# Altium footprint library SIM-Memory_Card Connectors.PcbLib: 17 footprints (part 1 of 2)
Each footprint in its own frame and in the unit in brackets; x right, y up, seen from the top. Pads: shape width x height; smd on the part's side, far side on the other; paste and mask are expansions set on the pad; w line width, h text height; cw(c..) or ccw(c..) is an arc to the next point about the centre after c.
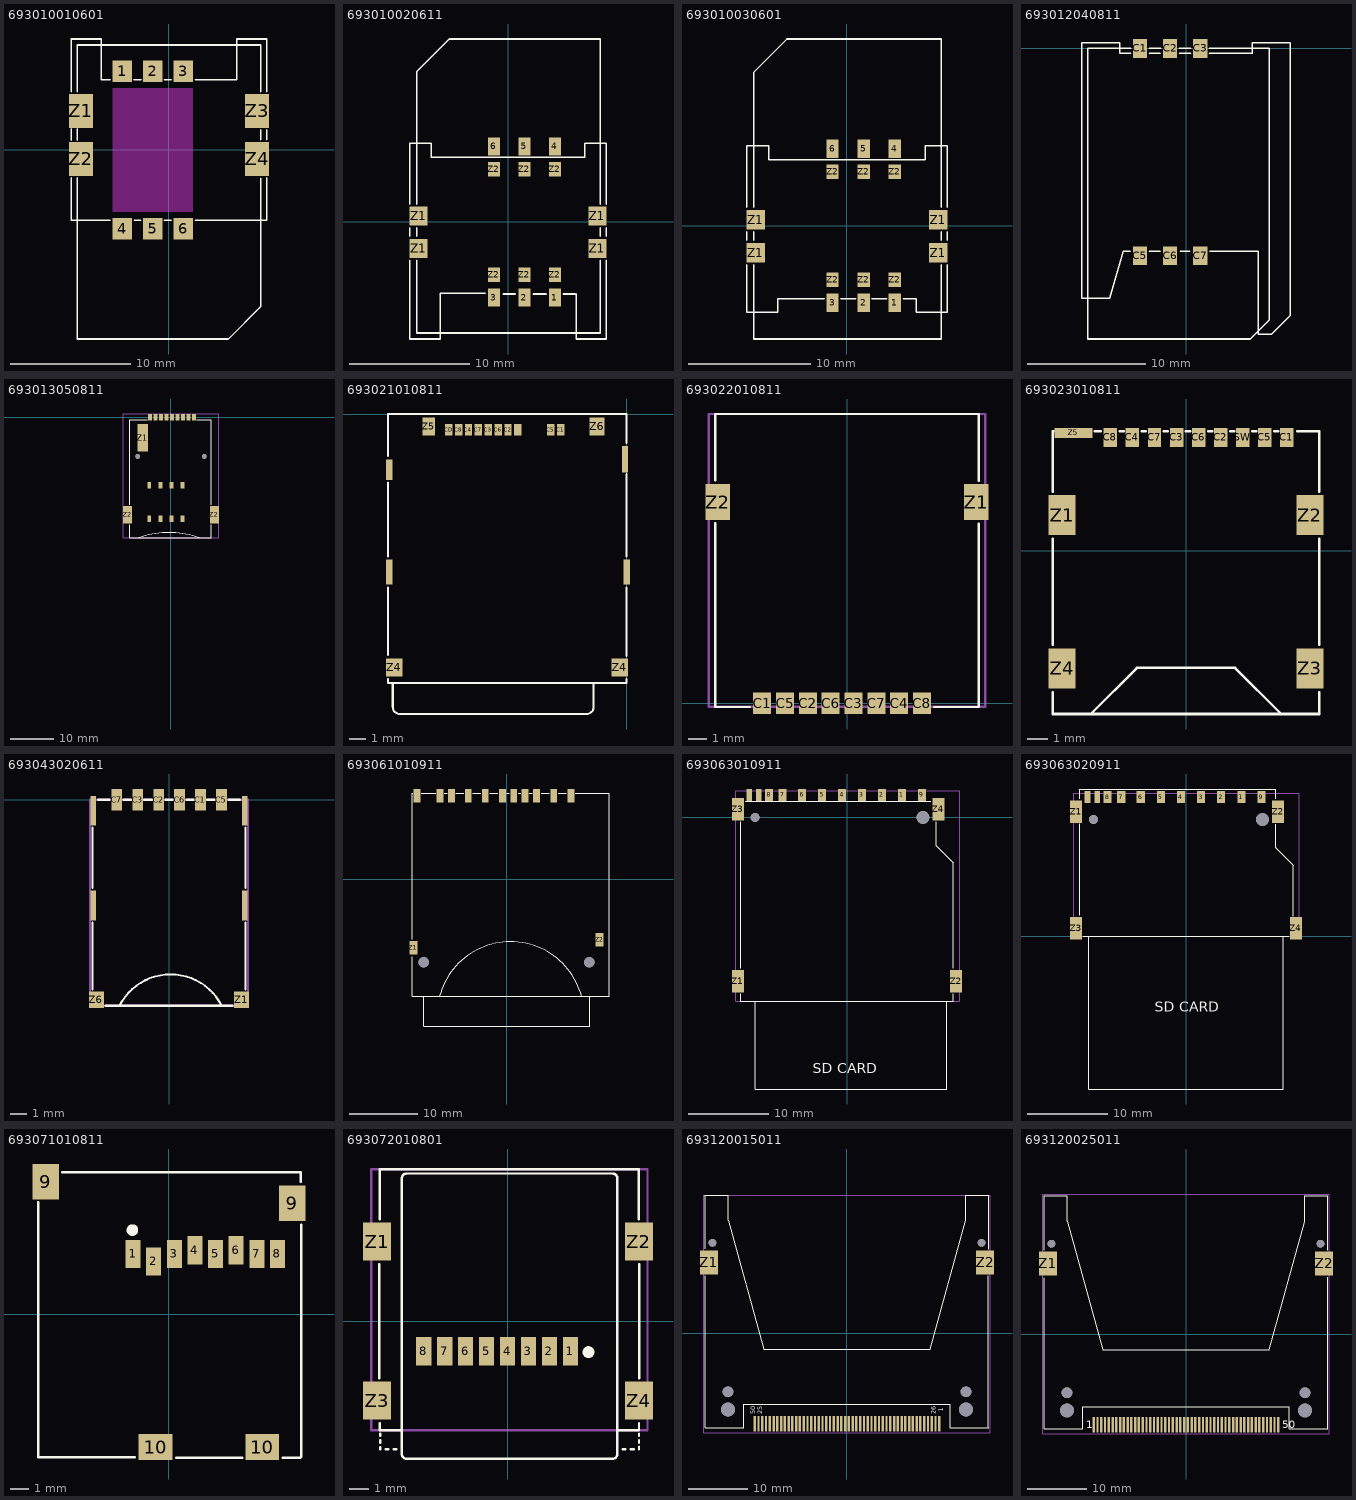
[diagram p0: the footprints below, top view; thin cyan lines are the x and y axes]

## 693010010601 [mm] "WR-CRD Mini SIM_Standard Header 6 pins    1.7 Heigth"
height 1.7
pads (10):
  rect 1.6x1.8 smd: 1(-3.9,6.55) 2(-1.36,6.55) 3(1.18,6.55) 4(-3.9,-6.55) 5(-1.36,-6.55) 6(1.18,-6.55)
  rect 2x2.8 smd: Z1(-7.35,3.25) Z2(-7.35,-0.75) Z3(7.35,3.25) Z4(7.35,-0.75)
Top Overlay:
  lines w0.127: -8.15,-2.3 -8.15,-5.85 -4.9,-5.85 ; -8.15,0.8 -8.15,1.75 ; -8.15,4.85 -8.15,9.25 -5.65,9.25 -5.65,5.85 -4.9,5.85 ; -7.65,-2.3 -7.65,-15.75 4.95,-15.75 7.65,-13.05 7.65,-2.35 ; -7.65,0.8 -7.65,1.75 ; -7.65,4.85 -7.65,8.75 7.65,8.75 7.65,4.85 ; -2.95,5.85 -2.3,5.85 ; -2.9,-5.85 -2.35,-5.85 ; -0.4,-5.85 0.2,-5.85 ; -0.4,5.85 0.2,5.85 ; 2.2,-5.85 8.15,-5.85 8.15,-2.3 ; 2.2,5.85 5.65,5.85 5.65,9.25 8.15,9.25 8.15,4.85 ; 7.65,0.85 7.65,1.7 ; 8.15,0.85 8.15,1.7
Keep-Out Layer:
  rectangle: -4.7,-5.15 1.98,5.15
3D body "693010010601.stp": height 1.71, standoff -0.04, extent -8.15,-6.85 8.15,9.25

## 693010020611 [mm] "WR-CRD Mini SIM_header_Shielded_6 pins    1.8 Heigth"
height 1.8
pads (16):
  rect 1x1.5 smd: 1(3.9,-6.3) 2(1.36,-6.3) 3(-1.18,-6.3) 4(3.9,6.3) 5(1.36,6.3) 6(-1.18,6.3)
  rect 1.5x1.6 smd: Z1(-7.45,-2.2) Z1(-7.45,0.5) Z1(7.45,-2.2) Z1(7.45,0.5)
  rect 1x1.2 smd: Z2(-1.18,-4.4) Z2(-1.18,4.4) Z2(1.36,-4.4) Z2(1.36,4.4) Z2(3.9,-4.4) Z2(3.9,4.4)
Top Overlay:
  lines w0.127: -8.2,-3.2 -8.2,-9.75 -5.63,-9.75 -5.63,-5.95 -1.9,-5.95 ; -8.2,-1.2 -8.2,-0.5 ; -8.2,1.5 -8.2,6.55 -6.4,6.55 -6.4,5.4 6.4,5.4 6.4,6.55 8.2,6.55 8.2,1.5 ; -7.6,-3.2 -7.6,-9.25 7.7,-9.25 7.7,-3.2 ; -7.6,-1.2 -7.6,-0.5 ; -7.6,1.5 -7.6,12.55 -4.9,15.25 7.7,15.25 7.7,1.5 ; -0.4,-6 0.6,-6 ; 2.1,-6 3.2,-6 ; 4.6,-6 5.62,-6 ; 5.67,-6 5.67,-9.75 8.2,-9.75 8.2,-3.2 ; 7.7,-1.2 7.7,-0.5 ; 8.2,-1.2 8.2,-0.5
3D body "693010020611.stp": height 1.81, standoff -0.04, extent -8.2,-9.75 8.2,6.55

## 693010030601 [mm] "WR-CRD Mini SIM_Card Stop_header_Shielded_ W/O card stop   6 pins    1.8 Heigth"
height 1.8
pads (16):
  rect 1x1.5 smd: 1(3.9,-6.3) 2(1.36,-6.3) 3(-1.18,-6.3) 4(3.9,6.3) 5(1.36,6.3) 6(-1.18,6.3)
  rect 1.5x1.6 smd: Z1(-7.45,-2.2) Z1(-7.45,0.5) Z1(7.45,-2.2) Z1(7.45,0.5)
  rect 1x1.2 smd: Z2(-1.18,-4.4) Z2(-1.18,4.4) Z2(1.36,-4.4) Z2(1.36,4.4) Z2(3.9,-4.4) Z2(3.9,4.4)
Top Overlay:
  lines w0.127: -8.2,-3.2 -8.2,-7.05 -5.65,-7.05 -5.65,-5.95 -1.875,-5.95 ; -8.2,-1.2 -8.2,-0.5 ; -8.2,1.5 -8.2,6.55 -6.4,6.55 -6.4,5.4 6.4,5.4 6.4,6.55 8.2,6.55 8.2,1.5 ; -7.6,-3.2 -7.6,-9.25 7.7,-9.25 7.7,-3.2 ; -7.6,-1.2 -7.6,-0.5 ; -7.6,1.5 -7.6,12.55 -4.9,15.25 7.7,15.25 7.7,1.5 ; -0.525,-5.95 0.7,-5.95 ; 2.025,-5.95 3.225,-5.95 ; 4.6,-5.95 5.65,-5.95 5.65,-7.05 8.2,-7.05 8.2,-3.2 ; 7.7,-1.2 7.7,-0.5 ; 8.2,-1.2 8.2,-0.5
3D body "693010030611.stp": height 1.81, standoff -0.04, extent -8.2,-7.05 8.2,6.55

## 693012040811 [mm] "WR-CRD mini SIM_Hinge type_6 pins_with cover shell_Housing Height 1.80mm"
height 1.8
pads (6):
  rect 1.2x1.6 smd: C1(-3.9,0) C2(-1.36,0) C3(1.18,0) C5(-3.9,-17.48) C6(-1.36,-17.48) C7(1.18,-17.48)
Top Overlay:
  lines w0.127: -4.707,-17.093 -5.325,-17.093 -6.449,-21.05 -8.82,-21.05 -8.82,0.5 -5.62,0.5 -5.62,-0.4 -4.7,-0.4 ; -4.7,0 -8.32,0 -8.32,-24.5 5.4,-24.5 6.98,-22.92 6.98,0 1.96,0 ; -3.1,-17.1 -2.2,-17.1 ; -3.1,-0.4 -2.18,-0.4 ; -3.1,0 -2.16,0 ; -0.6,0 0.4,0 ; -0.58,-0.4 0.4,-0.4 ; -0.5,-17.1 0.3,-17.1 ; 1.96,-0.4 5.58,-0.4 ; 2,-17.1 6.08,-17.1 6.08,-24.1 7.2,-24.1 8.78,-22.52 8.78,0.5 5.58,0.5 5.58,-0.4 ; 5.58,-0.4 5.58,-0.4
3D body "693012040811.stp": height 1.85, standoff 0, extent -8.82,-24.1 8.78,0.5

## 693013050811 [mm] "WR-CRD Mega SIM_Push and Push_8 pins_with Card Detection_Housing Height 1.50mm"
height 1.5
pads (22):
  rect 0.9x1.5 smd: CD(-4.835,0) P1(5.325,0) P2(2.785,0) P3(0.245,0) P4(-2.295,0) P5(4.055,0) P6(1.515,0) P7(-1.025,0) P8(-3.565,0) ""(-4.995,-23.3) ""(-4.995,-15.7) ""(-2.455,-23.3) ""(-2.455,-15.7) ""(0.085,-23.3) ""(0.085,-15.7) ""(2.625,-23.3) ""(2.625,-15.7)
  rect 2.5x6.35 smd: Z1(-6.5,-4.725)
  rect 2x4.1 smd: Z2(-10,-22.43) Z2(10,-22.43)
  round 1.1 hole 1.1 unplated: ""(-7.65,-9) ""(7.65,-9)
Top Overlay:
  lines w0.127: -9.45,-24.75 -9.45,-27.73 9.25,-27.73 9.25,-24.75 ; -9.45,-20.1 -9.45,-0.63 -5.48,-0.63 ; -7.409,-27.744 cw(c-0.459,-47.419) 6.45,-27.73 ; 5.92,-0.63 9.25,-0.63 9.25,-20.15
Mechanical 15:
  lines w0.127: -11,-27.73 -11,0.75 11,0.75 11,-27.73 -11,-27.73
3D body "693013050811.stp": height 1.5, standoff -0.5, extent -10.6,-27.73 10.4,0.272

## 693021010811 [mm] "Micro SIM Push & Push Type SMT - with Card Detection - 1.25mm Height"
height 1.25
pads (18):
  rect 0.45x0.68 smd: C1(-4,-0.96) C2(-7.2,-0.96) C3(-8.4,-0.96) C4(-9.6,-0.96) C5(-4.6,-0.96) C6(-7.8,-0.96) C7(-9,-0.96) C8(-10.2,-0.96) CD(-10.8,-0.96) COM(-6.6,-0.96)
  rect 0.37x1.25 smd: Z1(-14.415,-3.375)
  rect 0.37x1.6 smd: Z2(-0.085,-2.74)
  rect 0.37x1.5 smd: Z3(0.015,-9.6) Z4(-14.415,-9.6)
  rect 1x1.1 smd: Z4(-14.1,-15.4) Z4(-0.4,-15.4)
  rect 0.75x1.1 smd: Z5(-12.02,-0.75)
  rect 0.9x1.1 smd: Z6(-1.79,-0.75)
Top Overlay:
  lines w0.127: -14.5,-16.1 -14.5,-16.345 0,-16.345 0,-16.1 ; -14.5,-14.65 -14.5,-10.55 ; -14.5,-8.65 -14.5,-4.15 ; -14.5,-2.55 -14.5,0 0,0 0,-1.75 ; -14.2,-17.8 -14.2,-16.345 ; -14.2,-17.794 ccw(c-13.775,-17.8) -13.781,-18.225 ; -13.775,-18.225 -2.425,-18.225 ; -2.42,-18.225 ccw(c-2.425,-17.8) -2,-17.794 ; -2,-17.8 -2,-16.345 ; 0,-14.7 0,-10.55 ; 0,-8.65 0,-3.65
3D body "693021010811.stp": height 1.34, standoff 0, extent -14.5,-16.584 0,0

## 693022010811 [mm]
pads (10):
  rect 1x1.2 smd: C1(-4.72,0) C2(-2.18,0) C3(0.36,0) C4(2.9,0) C5(-3.45,0) C6(-0.91,0) C7(1.63,0) C8(4.17,0)
  rect 1.35x2 smd: Z1(7.2,11.2) Z2(-7.2,11.2)
Top Overlay:
  lines w0.127: -7.33,10.025 -7.33,-0.21 -5.415,-0.21 ; -7.33,12.395 -7.33,16.1 7.33,16.1 7.33,12.37 ; 4.845,-0.21 7.33,-0.21 7.33,10.005
Mechanical 13:
  lines w0.127: -7.7,-0.2 7.7,-0.2 7.7,16.1 -7.7,16.1 -7.7,-0.2
3D body "693022010811.stp": height 2.07, standoff -0.06, extent -7.7,-0.21 7.7,16.09

## 693023010811 [mm]
pads (14):
  rect 0.67x0.95 smd: C1(5.03,5.65) C2(1.73,5.65) C3(-0.47,5.65) C4(-2.67,5.65) C5(3.93,5.65) C6(0.63,5.65) C7(-1.57,5.65) C8(-3.77,5.65) SW(2.83,5.65)
  rect 1.35x2 smd: Z1(-6.175,1.775) Z2(6.175,1.775) Z3(6.175,-5.875) Z4(-6.175,-5.875)
  rect 1.88x0.5 smd: Z5(-5.61,5.875)
Top Overlay:
  lines w0.127: -6.65,-7.05 -6.65,-8.145 6.65,-8.145 6.65,-7.05 ; -6.65,-4.7 -6.65,0.6 ; -6.65,2.95 -6.65,5.955 -6.605,5.955 ; -4.75,-8.145 -2.45,-5.845 2.45,-5.845 4.75,-8.145 ; -4.55,5.95 -4.25,5.95 ; -3.3,5.95 -3.1,5.95 ; -2.2,5.95 -2,5.95 ; -1.1,5.95 -0.9,5.95 ; 0,5.95 0.2,5.95 ; 1.1,5.95 1.3,5.95 ; 2.2,5.95 2.4,5.95 ; 3.3,5.95 3.5,5.95 ; 4.4,5.95 4.6,5.95 ; 5.555,5.955 6.65,5.955 6.65,2.95 ; 6.65,-4.7 6.65,0.6
3D body "693023010811.stp": height 1.27, standoff 0, extent -6.65,-8.145 6.65,5.955

## 693043020611 [mm]
pads (12):
  rect 0.65x1.3 smd: C1(1.91,0) C2(-0.63,0) C3(-1.9,0) C5(3.18,0) C6(0.64,0) C7(-3.17,0)
  rect 0.9x1 smd: Z1(4.4,-12.14) Z6(-4.4,-12.14)
  rect 0.35x1.8 smd: Z2(4.595,-6.42) Z3(4.595,-0.67) Z4(-4.596,-0.67) Z5(-4.596,-6.42)
Top Overlay:
  lines w0.127: -4.65,-11.5 -4.65,-7.45 ; -4.65,-5.35 -4.65,-1.7 ; -4.3,0 -3.6,0 ; -3.85,-12.5 3.85,-12.5 ; -3,-12.5 cw(c0.1,-14.076) 3.2,-12.5 ; -2.75,0 -2.3,0 ; -1.5,0 -1.05,0 ; -0.2,0 0.2,0 ; 1.05,0 1.5,0 ; 2.3,0 2.75,0 ; 3.6,0 4.3,0 ; 4.65,-11.5 4.65,-7.45 ; 4.65,-5.35 4.65,-1.7
Mechanical 15:
  lines w0.127: -4.8,-12.5 4.8,-12.5 4.8,0 -4.8,0 -4.8,-12.5
3D body "693043020611.stp": height 1.2, standoff -0.01, extent -4.801,-12.5 4.8,0

## 693061010911 [mm] "WR-CRD SD_Push and Push_with card detection_9 pins"
height 2.85
pads (15):
  rect 1x2 smd: 1(6.9,12.155) 2(4.4,12.155) 3(1.05,12.155) 4(-0.6,12.155) 5(-3.1,12.155) 6(-5.6,12.155) 7(-8.02,12.155) 8(-9.72,12.155) 9(9.4,12.155) CD(2.7,12.155) WP(-13.07,12.155)
  rect 1.2x2 smd: Z1(-13.6,-10.055) Z2(13.6,-8.855)
  round 1.5 hole 1.5 unplated: ""(-12.1,-12.155) ""(12.1,-12.155)
Top Overlay:
  lines w0.127: -13.77,-11.33 -13.77,-17.155 15.03,-17.155 15.03,12.545 10.055,12.545 ; -13.77,-8.83 -13.77,12.545 -13.705,12.545 ; -12.45,12.545 -10.35,12.545 ; -12.1,-17.155 -12.1,-21.5 12.15,-21.5 12.15,-17.155 ; -9.8,-17.155 cw(c0.6,-19.915) 11,-17.155 ; -9.1,12.545 -8.65,12.545 ; -7.4,12.545 -6.25,12.545 ; -4.95,12.545 -3.75,12.545 ; -2.45,12.545 -1.25,12.545 ; 0.05,12.545 0.4,12.545 ; 1.7,12.545 2.05,12.545 ; 3.35,12.545 3.75,12.545 ; 5.05,12.545 6.25,12.545 ; 7.55,12.545 8.75,12.545
3D body "693061010911.stp": height 3.06, standoff -0.49, extent -13.8,-17.16 15,12.74

## 693063010911 [mm] "WR-CRD SD_Push and Pull_with card detection_9 pins"
height 3.3
pads (17):
  rect 1x1.5 smd: 1(6.875,2.8) 2(4.375,2.8) 3(1.875,2.8) 4(-0.625,2.8) 5(-3.125,2.8) 6(-5.625,2.8) 7(-8.05,2.8) 8(-9.75,2.8) 9(9.375,2.8)
  rect 0.7x1.5 smd: CDI(-11.05,2.8) WP(-12.25,2.8)
  rect 1.5x2.8 smd: Z1(-13.65,-20.5) Z2(13.65,-20.5) Z3(-13.65,1) Z4(11.45,1)
  round 1.1 hole 1.1 unplated: ""(-11.5,0)
  round 1.6 hole 1.6 unplated: ""(9.5,0)
Top Overlay:
  lines w0.127: -13.3,-22.1 -13.3,-23 13.3,-23 13.3,-22.1 ; -13.3,-18.9 -13.3,-0.55 ; -12.75,2 10.5,2 ; -11.5,-23 -11.5,-34 12.5,-34 12.5,-23 ; 11.2,-0.55 11.2,-3.55 13.3,-5.65 13.3,-18.9
  text "SD CARD" at -4.3,-32 h1.27
Mechanical 13:
  lines w0.127: -13.95,-23 14.094,-23 14.094,3.3 -13.95,3.3 -13.95,-23
  text "WP" at -11.845,3.965 h0.8
  text "CDI" at -10.6,3.925 h0.8
  text "1" at 6.7,3.9 h0.8
  text "9" at 9.1,3.9 h0.8
  text "8" at -10,4 h0.8
3D body "693063010911.stp": height 3.3, standoff -0.8, extent -13.95,-23 14.094,3.3

## 693063020911 [mm] "WR-CRD SD_Push and Pull_Short Version with Card Detection_9 pins"
height 2.8
pads (17):
  rect 1x1.5 smd: 1(6.825,17.297) 2(4.325,17.297) 3(1.825,17.297) 4(-0.675,17.297) 5(-3.175,17.297) 6(-5.675,17.297) 7(-8.1,17.297) 8(-9.8,17.297) 9(9.325,17.297)
  rect 0.7x1.5 smd: CD(-11.1,17.297) WP(-12.3,17.297)
  rect 1.5x2.8 smd: Z1(-13.7,15.497) Z2(11.4,15.497) Z3(-13.7,0.997) Z4(13.6,0.997)
  round 1.1 hole 1.1 unplated: ""(-11.55,14.497)
  round 1.6 hole 1.6 unplated: ""(9.45,14.497)
Top Overlay:
  lines w0.127: -13.25,2.6 -13.25,13.95 ; -13.25,17.1 -13.25,18.297 11.1,18.297 11.1,17.1 ; -12.85,0 12.75,0 ; 11.1,13.9 11.1,10.972 13.26,8.812 13.26,2.5 ; -12.15,-19 -12.15,0 12.05,0 12.05,-19 -12.15,-19
  text "SD CARD" at -3.95,-9.378 h1.27
Mechanical 13:
  lines w0.127: -14,0 14,0 14,17.75 -14,17.75 -14,0
  text "8" at -9.75,18.522 h0.8
  text "9" at 9.05,18.322 h0.8
  text "1" at 6.65,18.322 h0.8
  text "CD" at -10.65,18.422 h0.8
  text "WP" at -11.895,18.462 h0.8
3D body "693063020911.stp": height 2.81, standoff -0.84, extent -14,0 14,17.75

## 693071010811 [mm] "WR-CRD Micro SD_Push and Push_Card Detection_8 pins"
height 1.98
pads (12):
  rect 0.8x1.5 smd: 1(-1.915,3.225) 2(-0.815,2.825) 3(0.285,3.225) 4(1.385,3.425) 5(2.485,3.225) 6(3.585,3.425) 7(4.685,3.225) 8(5.785,3.225)
  rect 1.4x1.9 smd: 9(-6.575,7.075) 9(6.575,5.925)
  rect 1.8x1.4 smd: 10(-0.715,-7.075) 10(4.975,-7.075)
Top Overlay:
  circle w0.32: c-1.95,4.5 r0.15
  lines w0.127: -6.975,6 -6.975,-7.625 -1.825,-7.625 ; -5.7,7.585 7.025,7.585 7.025,7.075 ; 0.375,-7.65 3.9,-7.65 ; 6.075,-7.65 7,-7.65 ; 7.05,-7.6 7.05,4.8
3D body "693071010811.stp": height 1.84, standoff -0.06, extent -6.975,-7.625 7.025,7.585

## 693072010801 [mm] "WR-CRD Micro SD_Hinge_8 pins"
height 1.75
pads (12):
  rect 0.8x1.5 smd: 1(3.275,-1.575) 2(2.175,-1.575) 3(1.075,-1.575) 4(-0.025,-1.575) 5(-1.125,-1.575) 6(-2.225,-1.575) 7(-3.325,-1.575) 8(-4.425,-1.575)
  rect 1.45x2 smd: Z1(-6.875,4.175) Z2(6.875,4.175) Z3(-6.875,-4.175) Z4(6.875,-4.175)
Top Overlay:
  circle w0.32: c4.225,-1.625 r0.15
  lines w0.127: -6.75,-3 -6.75,3 ; -6.725,-5.35 -6.725,-5.725 -5.575,-5.725 ; -6.725,5.35 -6.725,7.975 6.875,7.975 6.875,5.35 ; -6.704,-6.727 -6.704,-6.606 ; -6.704,-6.377 -6.704,-6.256 ; -6.704,-6.025 -6.704,-5.915 ; -6.42,-6.728 -6.279,-6.728 ; -5.997,-6.728 -5.855,-6.728 ; 5.495,-7.225 ccw(c5.495,-6.975) 5.745,-6.975 5.745,-6.725 5.745,7.5 ccw(c5.495,7.5) 5.495,7.75 ; 5.5,-7.225 -5.325,-7.225 cw(c-5.325,-6.975) -5.575,-6.975 -5.575,-6.725 -5.575,7.5 cw(c-5.325,7.5) -5.325,7.75 5.5,7.75 ; 5.747,-5.725 6.876,-5.725 6.876,-5.349 ; 6.027,-6.725 6.169,-6.725 ; 6.451,-6.725 6.592,-6.725 ; 6.876,-6.724 6.876,-6.603 ; 6.876,-6.374 6.876,-6.253 ; 6.876,-6.022 6.876,-5.912 ; 6.9,-3 6.9,3
Mechanical 13:
  lines w0.127: -7.175,-5.725 -7.175,7.975 7.325,7.975 7.325,-5.725 -7.175,-5.725
3D body "693072010801.stp": height 1.78, standoff 0.01, extent -7.175,-5.725 7.325,7.975

## 693120015011 [mm] "WR-CRD Compact Flash_Header _50 pins"
height 7.05
pads (58):
  rect 0.4x2.6 smd: 1(15.558,-15.25) 2(14.288,-15.25) 3(13.018,-15.25) 4(11.748,-15.25) 5(10.478,-15.25) 6(9.208,-15.25) 7(7.938,-15.25) 8(6.668,-15.25) 9(5.398,-15.25) 10(4.128,-15.25) 11(2.858,-15.25) 12(1.588,-15.25) 13(0.318,-15.25) 14(-0.952,-15.25) 15(-2.222,-15.25) 16(-3.492,-15.25) 17(-4.762,-15.25) 18(-6.032,-15.25) 19(-7.302,-15.25) 20(-8.572,-15.25) 21(-9.842,-15.25) 22(-11.112,-15.25) 23(-12.382,-15.25) 24(-13.652,-15.25) 25(-14.922,-15.25) 26(14.923,-15.25) 27(13.653,-15.25) 28(12.383,-15.25) 29(11.113,-15.25) 30(9.843,-15.25) 31(8.573,-15.25) 32(7.303,-15.25) 33(6.033,-15.25) 34(4.763,-15.25) 35(3.493,-15.25) 36(2.223,-15.25) 37(0.953,-15.25) 38(-0.317,-15.25) 39(-1.587,-15.25) 40(-2.857,-15.25) 41(-4.127,-15.25) 42(-5.397,-15.25) 43(-6.667,-15.25) 44(-7.937,-15.25) 45(-9.207,-15.25) 46(-10.477,-15.25) 47(-11.747,-15.25) 48(-13.017,-15.25) 49(-14.287,-15.25) 50(-15.557,-15.25)
  rect 3x4 smd: Z1(-23.298,11.95) Z2(23.298,11.95)
  round 1.3 on Top hole 1.3 unplated: ""(-22.698,15.25) ""(22.698,15.25)
  round 2.3 hole 2.3 unplated: ""(-20.078,-12.85) ""(20.078,-12.85)
  round 1.8 hole 1.8 unplated: ""(-20.078,-9.85) ""(20.078,-9.85)
Top Overlay:
  lines w0.127: -23.925,-15.924 -23.925,9.75 ; -23.899,-15.95 -17.45,-15.95 -17.45,-11.95 17.45,-11.95 17.45,-15.95 23.9,-15.95 ; -23.899,14.224 -23.899,23.315 -20,23.315 ; 19.986,19 19.986,23.315 23.901,23.315 23.901,14.199 ; 20,19.05 14,-2.65 -14,-2.65 -20,19.05 -20,23.315 ; 23.85,-15.95 23.85,9.675 ; -20,23.315 -20,23.315
  text "1" at 16.198,-13.25 h0.8
  text "50" at -15.502,-13.65 h0.8
  text "26" at 14.998,-13.65 h0.8
  text "25" at -14.302,-13.65 h0.8
Mechanical 15:
  lines w0.127: -24.2,-16.8 24.2,-16.8 24.2,23.315 -24.2,23.315 -24.2,-16.8
3D body "693120015011.stp": height 6.3, standoff -0.75, extent -23.899,-15.95 23.901,23.386

## 693120025011 [mm] "WR-CRD Compact Flash_Reverse Header_50 pins"
height 6.06
pads (58):
  rect 0.4x2.6 smd: 1(-15.557,-15.25) 2(-14.287,-15.25) 3(-13.017,-15.25) 4(-11.747,-15.25) 5(-10.477,-15.25) 6(-9.207,-15.25) 7(-7.937,-15.25) 8(-6.667,-15.25) 9(-5.397,-15.25) 10(-4.127,-15.25) 11(-2.857,-15.25) 12(-1.587,-15.25) 13(-0.317,-15.25) 14(0.953,-15.25) 15(2.223,-15.25) 16(3.493,-15.25) 17(4.763,-15.25) 18(6.033,-15.25) 19(7.303,-15.25) 20(8.573,-15.25) 21(9.843,-15.25) 22(11.113,-15.25) 23(12.383,-15.25) 24(13.653,-15.25) 25(14.923,-15.25) 26(-14.922,-15.25) 27(-13.652,-15.25) 28(-12.382,-15.25) 29(-11.112,-15.25) 30(-9.842,-15.25) 31(-8.572,-15.25) 32(-7.302,-15.25) 33(-6.032,-15.25) 34(-4.762,-15.25) 35(-3.492,-15.25) 36(-2.222,-15.25) 37(-0.952,-15.25) 38(0.318,-15.25) 39(1.588,-15.25) 40(2.858,-15.25) 41(4.128,-15.25) 42(5.398,-15.25) 43(6.668,-15.25) 44(7.938,-15.25) 45(9.208,-15.25) 46(10.478,-15.25) 47(11.748,-15.25) 48(13.018,-15.25) 49(14.288,-15.25) 50(15.558,-15.25)
  rect 3x4 smd: Z1(-23.298,11.95) Z2(23.298,11.95)
  round 1.3 hole 1.3 unplated: ""(-22.7,15.25) ""(22.7,15.25)
  round 2.3 hole 2.3 unplated: ""(-20.078,-12.85) ""(20.078,-12.85)
  round 1.8 hole 1.8 unplated: ""(-20.078,-9.85) ""(20.078,-9.85)
Top Overlay:
  lines w0.127: -23.898,9.552 -23.898,-15.95 -17.447,-15.95 -17.447,-12.251 ; -23.898,14.202 -23.898,23.386 -20,23.386 -20,19.05 -14,-2.65 14,-2.65 19.986,19 19.986,23.386 23.907,23.386 23.907,14.157 ; -17.446,-12.25 17.447,-12.25 ; 23.907,9.657 23.907,-15.95 17.448,-15.95 17.448,-12.251 ; 17.447,-12.25 17.448,-12.251
  text "50" at 16.193,-15.885 h1.27
  text "1" at -16.827,-15.885 h1.27
Mechanical 15:
  lines w0.127: -24.2,-16.8 24.2,-16.8 24.2,23.636 -24.2,23.636 -24.2,-16.8
3D body "693120025011.stp": height 6.31, standoff -0.74, extent -23.899,-15.95 23.901,23.386